# Altium schematic symbol library jlcpcb_2025_04_inductors_extended_0603.schlib: 1269 symbols (part 2 of 7) (continued)
## FEC0603CP-R10G-LRH
designator L?  Inductance: 100nH
Inductor, 100nH, ±2%, 580mΩ, 400mA, SMD 0603; Manufacturer: PSA(Prosperity Dielectrics); Manufacturer Part Number: FEC0603CP-R10G-LRH; Package Size: 0603; JLCPCB Basic Part: No; JLCPCB Part Number: C346335; Supplier 1: LCSC; Category: Inductors; Supplier Part Number 1: C346335; Tolerance: ±2%; Rated Current: 400mA; DC Resistance: 580mΩ; RoHS: Yes; ComponentLink1Description: Datasheet; ComponentLink1URL: https://wmsc.lcsc.com/wmsc/upload/file/pdf/v2/lcsc/2304140030_PSA-Prosperity-Dielectrics-FEC0603CP-R10G-LRH_C346335.pdf; ComponentLink2Description: JLCPCB Part URL; ComponentLink2URL: https://jlcpcb.com/partdetail/C346335; ComponentLink3Description: LCSC Part URL; ComponentLink3URL: https://lcsc.com/product-detail/Inductors-SMD_PSAProsperity-Dielectrics-PSAProsperity-Dielectrics-FEC0603CP-R10G-LRH_C346335.html
footprint IND-0603 (0603 (1608M) Inductor)
pins: 1, 2

## FEC0603CP-R11G-LRH
designator L?  Inductance: 110nH
Inductor, 110nH, ±2%, 610mΩ, 300mA, SMD 0603; Manufacturer: PSA(Prosperity Dielectrics); Manufacturer Part Number: FEC0603CP-R11G-LRH; Package Size: 0603; JLCPCB Basic Part: No; JLCPCB Part Number: C346336; Supplier 1: LCSC; Category: Inductors; Supplier Part Number 1: C346336; Tolerance: ±2%; Rated Current: 300mA; DC Resistance: 610mΩ; RoHS: Yes; ComponentLink1Description: Datasheet; ComponentLink1URL: https://wmsc.lcsc.com/wmsc/upload/file/pdf/v2/lcsc/2304140030_PSA-Prosperity-Dielectrics-FEC0603CP-R11G-LRH_C346336.pdf; ComponentLink2Description: JLCPCB Part URL; ComponentLink2URL: https://jlcpcb.com/partdetail/C346336; ComponentLink3Description: LCSC Part URL; ComponentLink3URL: https://lcsc.com/product-detail/Inductors-SMD_PSAProsperity-Dielectrics-PSAProsperity-Dielectrics-FEC0603CP-R11G-LRH_C346336.html
footprint IND-0603 (0603 (1608M) Inductor)
pins: 1, 2

## FEC0603CP-R15G-LRH
designator L?  Inductance: 150nH
Inductor, 150nH, ±2%, 920mΩ, 280mA, SMD 0603; Manufacturer: PSA(Prosperity Dielectrics); Manufacturer Part Number: FEC0603CP-R15G-LRH; Package Size: 0603; JLCPCB Basic Part: No; JLCPCB Part Number: C346338; Supplier 1: LCSC; Category: Inductors; Supplier Part Number 1: C346338; Tolerance: ±2%; Rated Current: 280mA; DC Resistance: 920mΩ; RoHS: Yes; ComponentLink1Description: Datasheet; ComponentLink1URL: https://wmsc.lcsc.com/wmsc/upload/file/pdf/v2/lcsc/2304140030_PSA-Prosperity-Dielectrics-FEC0603CP-R15G-LRH_C346338.pdf; ComponentLink2Description: JLCPCB Part URL; ComponentLink2URL: https://jlcpcb.com/partdetail/C346338; ComponentLink3Description: LCSC Part URL; ComponentLink3URL: https://lcsc.com/product-detail/Inductors-SMD_PSAProsperity-Dielectrics-PSAProsperity-Dielectrics-FEC0603CP-R15G-LRH_C346338.html
footprint IND-0603 (0603 (1608M) Inductor)
pins: 1, 2

## FEC0603CP-R20G-LRH
designator L?  Inductance: 200nH
Inductor, 200nH, ±2%, 1.98Ω, 200mA, SMD 0603; Manufacturer: PSA(Prosperity Dielectrics); Manufacturer Part Number: FEC0603CP-R20G-LRH; Package Size: 0603; JLCPCB Basic Part: No; JLCPCB Part Number: C346340; Supplier 1: LCSC; Category: Inductors; Supplier Part Number 1: C346340; Tolerance: ±2%; Rated Current: 200mA; DC Resistance: 1.98Ω; RoHS: Yes; ComponentLink1Description: Datasheet; ComponentLink1URL: https://wmsc.lcsc.com/wmsc/upload/file/pdf/v2/lcsc/2304140030_PSA-Prosperity-Dielectrics-FEC0603CP-R20G-LRH_C346340.pdf; ComponentLink2Description: JLCPCB Part URL; ComponentLink2URL: https://jlcpcb.com/partdetail/C346340; ComponentLink3Description: LCSC Part URL; ComponentLink3URL: https://lcsc.com/product-detail/Inductors-SMD_PSAProsperity-Dielectrics-PSAProsperity-Dielectrics-FEC0603CP-R20G-LRH_C346340.html
footprint IND-0603 (0603 (1608M) Inductor)
pins: 1, 2

## FEC0603CP-R21G-LRH
designator L?  Inductance: 210nH
Inductor, 210nH, ±2%, 2.06Ω, 200mA, SMD 0603; Manufacturer: PSA(Prosperity Dielectrics); Manufacturer Part Number: FEC0603CP-R21G-LRH; Package Size: 0603; JLCPCB Basic Part: No; JLCPCB Part Number: C346341; Supplier 1: LCSC; Category: Inductors; Supplier Part Number 1: C346341; Tolerance: ±2%; Rated Current: 200mA; DC Resistance: 2.06Ω; RoHS: Yes; ComponentLink1Description: Datasheet; ComponentLink1URL: https://wmsc.lcsc.com/wmsc/upload/file/pdf/v2/lcsc/2304140030_PSA-Prosperity-Dielectrics-FEC0603CP-R21G-LRH_C346341.pdf; ComponentLink2Description: JLCPCB Part URL; ComponentLink2URL: https://jlcpcb.com/partdetail/C346341; ComponentLink3Description: LCSC Part URL; ComponentLink3URL: https://lcsc.com/product-detail/Inductors-SMD_PSAProsperity-Dielectrics-PSAProsperity-Dielectrics-FEC0603CP-R21G-LRH_C346341.html
footprint IND-0603 (0603 (1608M) Inductor)
pins: 1, 2

## FEC0603CP-R22G-LRH
designator L?  Inductance: 220nH
Inductor, 220nH, ±2%, 1.9Ω, 200mA, SMD 0603; Manufacturer: PSA(Prosperity Dielectrics); Manufacturer Part Number: FEC0603CP-R22G-LRH; Package Size: 0603; JLCPCB Basic Part: No; JLCPCB Part Number: C329439; Supplier 1: LCSC; Category: Inductors; Supplier Part Number 1: C329439; Tolerance: ±2%; Rated Current: 200mA; DC Resistance: 1.9Ω; RoHS: Yes; ComponentLink1Description: Datasheet; ComponentLink1URL: https://wmsc.lcsc.com/wmsc/upload/file/pdf/v2/lcsc/2304140030_PSA-Prosperity-Dielectrics-FEC0603CP-R22G-LRH_C329439.pdf; ComponentLink2Description: JLCPCB Part URL; ComponentLink2URL: https://jlcpcb.com/partdetail/C329439; ComponentLink3Description: LCSC Part URL; ComponentLink3URL: https://lcsc.com/product-detail/Inductors-SMD_PSAProsperity-Dielectrics-PSAProsperity-Dielectrics-FEC0603CP-R22G-LRH_C329439.html
footprint IND-0603 (0603 (1608M) Inductor)
pins: 1, 2

## FEC0603CP-R25G-LRH
designator L?  Inductance: 250nH
Inductor, 250nH, ±2%, 3.55Ω, 120mA, SMD 0603; Manufacturer: PSA(Prosperity Dielectrics); Manufacturer Part Number: FEC0603CP-R25G-LRH; Package Size: 0603; JLCPCB Basic Part: No; JLCPCB Part Number: C346342; Supplier 1: LCSC; Category: Inductors; Supplier Part Number 1: C346342; Tolerance: ±2%; Rated Current: 120mA; DC Resistance: 3.55Ω; RoHS: Yes; ComponentLink1Description: Datasheet; ComponentLink1URL: https://wmsc.lcsc.com/wmsc/upload/file/pdf/v2/lcsc/2304140030_PSA-Prosperity-Dielectrics-FEC0603CP-R25G-LRH_C346342.pdf; ComponentLink2Description: JLCPCB Part URL; ComponentLink2URL: https://jlcpcb.com/partdetail/C346342; ComponentLink3Description: LCSC Part URL; ComponentLink3URL: https://lcsc.com/product-detail/Inductors-SMD_PSAProsperity-Dielectrics-PSAProsperity-Dielectrics-FEC0603CP-R25G-LRH_C346342.html
footprint IND-0603 (0603 (1608M) Inductor)
pins: 1, 2

## FEC0603CP-R27G-LRH
designator L?  Inductance: 270nH
Inductor, 270nH, ±2%, 2.3Ω, 170mA, SMD 0603; Manufacturer: PSA(Prosperity Dielectrics); Manufacturer Part Number: FEC0603CP-R27G-LRH; Package Size: 0603; JLCPCB Basic Part: No; JLCPCB Part Number: C346343; Supplier 1: LCSC; Category: Inductors; Supplier Part Number 1: C346343; Tolerance: ±2%; Rated Current: 170mA; DC Resistance: 2.3Ω; RoHS: Yes; ComponentLink1Description: Datasheet; ComponentLink1URL: https://wmsc.lcsc.com/wmsc/upload/file/pdf/v2/lcsc/2304140030_PSA-Prosperity-Dielectrics-FEC0603CP-R27G-LRH_C346343.pdf; ComponentLink2Description: JLCPCB Part URL; ComponentLink2URL: https://jlcpcb.com/partdetail/C346343; ComponentLink3Description: LCSC Part URL; ComponentLink3URL: https://lcsc.com/product-detail/Inductors-SMD_PSAProsperity-Dielectrics-PSAProsperity-Dielectrics-FEC0603CP-R27G-LRH_C346343.html
footprint IND-0603 (0603 (1608M) Inductor)
pins: 1, 2

## FEC0603CP-R39G-LRH
designator L?  Inductance: 390nH
Inductor, 390nH, ±2%, 4.35Ω, 100mA, SMD 0603; Manufacturer: PSA(Prosperity Dielectrics); Manufacturer Part Number: FEC0603CP-R39G-LRH; Package Size: 0603; JLCPCB Basic Part: No; JLCPCB Part Number: C346345; Supplier 1: LCSC; Category: Inductors; Supplier Part Number 1: C346345; Tolerance: ±2%; Rated Current: 100mA; DC Resistance: 4.35Ω; RoHS: Yes; ComponentLink1Description: Datasheet; ComponentLink1URL: https://wmsc.lcsc.com/wmsc/upload/file/pdf/v2/lcsc/2005211034_PSA-Prosperity-Dielectrics-FEC0603CP-R39G-LRH_C346345.pdf; ComponentLink2Description: JLCPCB Part URL; ComponentLink2URL: https://jlcpcb.com/partdetail/C346345; ComponentLink3Description: LCSC Part URL; ComponentLink3URL: https://lcsc.com/product-detail/Inductors-SMD_PSAProsperity-Dielectrics-PSAProsperity-Dielectrics-FEC0603CP-R39G-LRH_C346345.html
footprint IND-0603 (0603 (1608M) Inductor)
pins: 1, 2

## FHW0603PF1R0KST
designator L?  Inductance: 1uH
Inductor, 1uH, SMD 0603; Manufacturer: FH (Guangdong Fenghua Advanced Tech); Manufacturer Part Number: FHW0603PF1R0KST; Package Size: 0603; JLCPCB Basic Part: No; JLCPCB Part Number: C5137247; Supplier 1: LCSC; Category: Inductors; Supplier Part Number 1: C5137247; RoHS: Yes; ComponentLink1Description: Datasheet; ComponentLink1URL: https://wmsc.lcsc.com/wmsc/upload/file/pdf/v2/lcsc/2303141630_FH--Guangdong-Fenghua-Advanced-Tech-FHW0603PF1R0KST_C5137247.pdf; ComponentLink2Description: JLCPCB Part URL; ComponentLink2URL: https://jlcpcb.com/partdetail/C5137247; ComponentLink3Description: LCSC Part URL; ComponentLink3URL: https://lcsc.com/product-detail/Inductors-SMD_FH-Guangdong-Fenghua-Advanced-Tech-FH-Guangdong-Fenghua-Advanced-Tech-FHW0603PF1R0KST_C5137247.html
footprint IND-0603 (0603 (1608M) Inductor)
pins: 1, 2

## FHW0603UC1N6KST
designator L?  Inductance: 1.6nH
Inductor, 1.6nH, ±10%, 40mΩ, 700mA, SMD 0603; Manufacturer: FH(Guangdong Fenghua Advanced Tech); Manufacturer Part Number: FHW0603UC1N6KST; Self-Resonant Frequency: 12.5GHz; Q Factor: 18@250MHz; Package Size: 0603; JLCPCB Basic Part: No; JLCPCB Part Number: C317978; Supplier 1: LCSC; Category: Inductors; Supplier Part Number 1: C317978; Tolerance: ±10%; Rated Current: 700mA; DC Resistance: 40mΩ; RoHS: Yes; ComponentLink1Description: Datasheet; ComponentLink1URL: https://wmsc.lcsc.com/wmsc/upload/file/pdf/v2/lcsc/2302231208_FH--Guangdong-Fenghua-Advanced-Tech-FHW0603UC1N6KST_C317978.pdf; ComponentLink2Description: JLCPCB Part URL; ComponentLink2URL: https://jlcpcb.com/partdetail/C317978; ComponentLink3Description: LCSC Part URL; ComponentLink3URL: https://lcsc.com/product-detail/Inductors-SMD_FH-Guangdong-Fenghua-Advanced-Tech-FH-Guangdong-Fenghua-Advanced-Tech-FHW0603UC1N6KST_C317978.html
footprint IND-0603 (0603 (1608M) Inductor)
pins: 1, 2

## FHW0603UC1N8KST
designator L?  Inductance: 1.8nH
Inductor, 1.8nH, ±10%, 45mΩ, 700mA, SMD 0603; Manufacturer: FH(Guangdong Fenghua Advanced Tech); Manufacturer Part Number: FHW0603UC1N8KST; Self-Resonant Frequency: 12.5GHz; Q Factor: 16@250MHz; Package Size: 0603; JLCPCB Basic Part: No; JLCPCB Part Number: C317979; Supplier 1: LCSC; Category: Inductors; Supplier Part Number 1: C317979; Tolerance: ±10%; Rated Current: 700mA; DC Resistance: 45mΩ; RoHS: Yes; ComponentLink1Description: Datasheet; ComponentLink1URL: https://wmsc.lcsc.com/wmsc/upload/file/pdf/v2/lcsc/2302231208_FH--Guangdong-Fenghua-Advanced-Tech-FHW0603UC1N8KST_C317979.pdf; ComponentLink2Description: JLCPCB Part URL; ComponentLink2URL: https://jlcpcb.com/partdetail/C317979; ComponentLink3Description: LCSC Part URL; ComponentLink3URL: https://lcsc.com/product-detail/Inductors-SMD_FH-Guangdong-Fenghua-Advanced-Tech-FH-Guangdong-Fenghua-Advanced-Tech-FHW0603UC1N8KST_C317979.html
footprint IND-0603 (0603 (1608M) Inductor)
pins: 1, 2

## FHW0603UC2N2KST
designator L?  Inductance: 2.2nH
Inductor, 2.2nH, ±10%, 90mΩ, 700mA, SMD 0603; Manufacturer: FH(Guangdong Fenghua Advanced Tech); Manufacturer Part Number: FHW0603UC2N2KST; Self-Resonant Frequency: 10GHz; Q Factor: 12@250MHz; Package Size: 0603; JLCPCB Basic Part: No; JLCPCB Part Number: C317980; Supplier 1: LCSC; Category: Inductors; Supplier Part Number 1: C317980; Tolerance: ±10%; Rated Current: 700mA; DC Resistance: 90mΩ; RoHS: Yes; ComponentLink1Description: Datasheet; ComponentLink1URL: https://wmsc.lcsc.com/wmsc/upload/file/pdf/v2/lcsc/2302231208_FH--Guangdong-Fenghua-Advanced-Tech-FHW0603UC2N2KST_C317980.pdf; ComponentLink2Description: JLCPCB Part URL; ComponentLink2URL: https://jlcpcb.com/partdetail/C317980; ComponentLink3Description: LCSC Part URL; ComponentLink3URL: https://lcsc.com/product-detail/Inductors-SMD_FH-Guangdong-Fenghua-Advanced-Tech-FH-Guangdong-Fenghua-Advanced-Tech-FHW0603UC2N2KST_C317980.html
footprint IND-0603 (0603 (1608M) Inductor)
pins: 1, 2

## FHW0603UC3N3KST
designator L?  Inductance: 3.3nH
Inductor, 3.3nH, ±10%, 75mΩ, 700mA, SMD 0603; Manufacturer: FH(Guangdong Fenghua Advanced Tech); Manufacturer Part Number: FHW0603UC3N3KST; Self-Resonant Frequency: 5.9GHz; Q Factor: 20@250MHz; Package Size: 0603; JLCPCB Basic Part: No; JLCPCB Part Number: C317981; Supplier 1: LCSC; Category: Inductors; Supplier Part Number 1: C317981; Tolerance: ±10%; Rated Current: 700mA; DC Resistance: 75mΩ; RoHS: Yes; ComponentLink1Description: Datasheet; ComponentLink1URL: https://wmsc.lcsc.com/wmsc/upload/file/pdf/v2/lcsc/2302231208_FH--Guangdong-Fenghua-Advanced-Tech-FHW0603UC3N3KST_C317981.pdf; ComponentLink2Description: JLCPCB Part URL; ComponentLink2URL: https://jlcpcb.com/partdetail/C317981; ComponentLink3Description: LCSC Part URL; ComponentLink3URL: https://lcsc.com/product-detail/Inductors-SMD_FH-Guangdong-Fenghua-Advanced-Tech-FH-Guangdong-Fenghua-Advanced-Tech-FHW0603UC3N3KST_C317981.html
footprint IND-0603 (0603 (1608M) Inductor)
pins: 1, 2

## FHW0603UC3N6JST
designator L?  Inductance: 3.6nH
Inductor, 3.6nH, ±5%, SMD 0603; Manufacturer: FH(Guangdong Fenghua Advanced Tech); Manufacturer Part Number: FHW0603UC3N6JST; Package Size: 0603; JLCPCB Basic Part: No; JLCPCB Part Number: C304270; Supplier 1: LCSC; Category: Inductors; Supplier Part Number 1: C304270; Tolerance: ±5%; RoHS: Yes; ComponentLink1Description: Datasheet; ComponentLink1URL: https://wmsc.lcsc.com/wmsc/upload/file/pdf/v2/lcsc/2302231030_FH--Guangdong-Fenghua-Advanced-Tech-FHW0603UC3N6JST_C304270.pdf; ComponentLink2Description: JLCPCB Part URL; ComponentLink2URL: https://jlcpcb.com/partdetail/C304270; ComponentLink3Description: LCSC Part URL; ComponentLink3URL: https://lcsc.com/product-detail/Inductors-SMD_FH-Guangdong-Fenghua-Advanced-Tech-FH-Guangdong-Fenghua-Advanced-Tech-FHW0603UC3N6JST_C304270.html
footprint IND-0603 (0603 (1608M) Inductor)
pins: 1, 2

## FHW0603UC3N6KST
designator L?  Inductance: 3.6nH
Inductor, 3.6nH, ±10%, SMD 0603; Manufacturer: FH(Guangdong Fenghua Advanced Tech); Manufacturer Part Number: FHW0603UC3N6KST; Package Size: 0603; JLCPCB Basic Part: No; JLCPCB Part Number: C395034; Supplier 1: LCSC; Category: Inductors; Supplier Part Number 1: C395034; Tolerance: ±10%; RoHS: Yes; ComponentLink1Description: Datasheet; ComponentLink1URL: https://wmsc.lcsc.com/wmsc/upload/file/pdf/v2/lcsc/2302231208_FH--Guangdong-Fenghua-Advanced-Tech-FHW0603UC3N6KST_C395034.pdf; ComponentLink2Description: JLCPCB Part URL; ComponentLink2URL: https://jlcpcb.com/partdetail/C395034; ComponentLink3Description: LCSC Part URL; ComponentLink3URL: https://lcsc.com/product-detail/Inductors-SMD_FH-Guangdong-Fenghua-Advanced-Tech-FH-Guangdong-Fenghua-Advanced-Tech-FHW0603UC3N6KST_C395034.html
footprint IND-0603 (0603 (1608M) Inductor)
pins: 1, 2

## FHW0603UC3N9JST
designator L?  Inductance: 3.9nH
Inductor, 3.9nH, ±5%, 80mΩ, 700mA, SMD 0603; Manufacturer: FH(Guangdong Fenghua Advanced Tech); Manufacturer Part Number: FHW0603UC3N9JST; Self-Resonant Frequency: 6.9GHz; Q Factor: 22@250MHz; Package Size: 0603; JLCPCB Basic Part: No; JLCPCB Part Number: C317982; Supplier 1: LCSC; Category: Inductors; Supplier Part Number 1: C317982; Tolerance: ±5%; Rated Current: 700mA; DC Resistance: 80mΩ; RoHS: Yes; ComponentLink1Description: Datasheet; ComponentLink1URL: https://wmsc.lcsc.com/wmsc/upload/file/pdf/v2/lcsc/2302231208_FH--Guangdong-Fenghua-Advanced-Tech-FHW0603UC3N9JST_C317982.pdf; ComponentLink2Description: JLCPCB Part URL; ComponentLink2URL: https://jlcpcb.com/partdetail/C317982; ComponentLink3Description: LCSC Part URL; ComponentLink3URL: https://lcsc.com/product-detail/Inductors-SMD_FH-Guangdong-Fenghua-Advanced-Tech-FH-Guangdong-Fenghua-Advanced-Tech-FHW0603UC3N9JST_C317982.html
footprint IND-0603 (0603 (1608M) Inductor)
pins: 1, 2

## FHW0603UC4N7JGT
designator L?  Inductance: 4.7nH
Inductor, 4.7nH, ±5%, 116mΩ, 700mA, SMD 0603; Manufacturer: FH(Guangdong Fenghua Advanced Tech); Manufacturer Part Number: FHW0603UC4N7JGT; Self-Resonant Frequency: 5.8GHz; Q Factor: 20@250MHz; Package Size: 0603; JLCPCB Basic Part: No; JLCPCB Part Number: C139256; Supplier 1: LCSC; Category: Inductors; Supplier Part Number 1: C139256; Tolerance: ±5%; Rated Current: 700mA; DC Resistance: 116mΩ; RoHS: Yes; ComponentLink1Description: Datasheet; ComponentLink1URL: https://wmsc.lcsc.com/wmsc/upload/file/pdf/v2/lcsc/2110111630_FH--Guangdong-Fenghua-Advanced-Tech-FHW0603UC4N7JGT_C139256.pdf; ComponentLink2Description: JLCPCB Part URL; ComponentLink2URL: https://jlcpcb.com/partdetail/C139256; ComponentLink3Description: LCSC Part URL; ComponentLink3URL: https://lcsc.com/product-detail/Inductors-SMD_FH-Guangdong-Fenghua-Advanced-Tech-FH-Guangdong-Fenghua-Advanced-Tech-FHW0603UC4N7JGT_C139256.html
footprint IND-0603 (0603 (1608M) Inductor)
pins: 1, 2

## FHW0603UC4N7JST
designator L?  Inductance: 4.7nH
Inductor, 4.7nH, ±5%, 116mΩ, 700mA, SMD 0603; Manufacturer: FH(Guangdong Fenghua Advanced Tech); Manufacturer Part Number: FHW0603UC4N7JST; Self-Resonant Frequency: 5.8GHz; Q Factor: 20@250MHz; Package Size: 0603; JLCPCB Basic Part: No; JLCPCB Part Number: C317983; Supplier 1: LCSC; Category: Inductors; Supplier Part Number 1: C317983; Tolerance: ±5%; Rated Current: 700mA; DC Resistance: 116mΩ; RoHS: Yes; ComponentLink1Description: Datasheet; ComponentLink1URL: https://wmsc.lcsc.com/wmsc/upload/file/pdf/v2/lcsc/2302231208_FH--Guangdong-Fenghua-Advanced-Tech-FHW0603UC4N7JST_C317983.pdf; ComponentLink2Description: JLCPCB Part URL; ComponentLink2URL: https://jlcpcb.com/partdetail/C317983; ComponentLink3Description: LCSC Part URL; ComponentLink3URL: https://lcsc.com/product-detail/Inductors-SMD_FH-Guangdong-Fenghua-Advanced-Tech-FH-Guangdong-Fenghua-Advanced-Tech-FHW0603UC4N7JST_C317983.html
footprint IND-0603 (0603 (1608M) Inductor)
pins: 1, 2

## FHW0603UC5N1JST
designator L?  Inductance: 5.1nH
Inductor, 5.1nH, ±5%, SMD 0603; Manufacturer: FH(Guangdong Fenghua Advanced Tech); Manufacturer Part Number: FHW0603UC5N1JST; Package Size: 0603; JLCPCB Basic Part: No; JLCPCB Part Number: C395036; Supplier 1: LCSC; Category: Inductors; Supplier Part Number 1: C395036; Tolerance: ±5%; RoHS: Yes; ComponentLink1Description: Datasheet; ComponentLink1URL: https://wmsc.lcsc.com/wmsc/upload/file/pdf/v2/lcsc/2302231208_FH--Guangdong-Fenghua-Advanced-Tech-FHW0603UC5N1JST_C395036.pdf; ComponentLink2Description: JLCPCB Part URL; ComponentLink2URL: https://jlcpcb.com/partdetail/C395036; ComponentLink3Description: LCSC Part URL; ComponentLink3URL: https://lcsc.com/product-detail/Inductors-SMD_FH-Guangdong-Fenghua-Advanced-Tech-FH-Guangdong-Fenghua-Advanced-Tech-FHW0603UC5N1JST_C395036.html
footprint IND-0603 (0603 (1608M) Inductor)
pins: 1, 2

## FHW0603UC5N6KST
designator L?  Inductance: 5.6nH
Inductor, 5.6nH, ±10%, 200mΩ, 700mA, SMD 0603; Manufacturer: FH(Guangdong Fenghua Advanced Tech); Manufacturer Part Number: FHW0603UC5N6KST; Self-Resonant Frequency: 5.7GHz; Q Factor: 18@250MHz; Package Size: 0603; JLCPCB Basic Part: No; JLCPCB Part Number: C317984; Supplier 1: LCSC; Category: Inductors; Supplier Part Number 1: C317984; Tolerance: ±10%; Rated Current: 700mA; DC Resistance: 200mΩ; RoHS: Yes; ComponentLink1Description: Datasheet; ComponentLink1URL: https://wmsc.lcsc.com/wmsc/upload/file/pdf/v2/lcsc/2302231208_FH--Guangdong-Fenghua-Advanced-Tech-FHW0603UC5N6KST_C317984.pdf; ComponentLink2Description: JLCPCB Part URL; ComponentLink2URL: https://jlcpcb.com/partdetail/C317984; ComponentLink3Description: LCSC Part URL; ComponentLink3URL: https://lcsc.com/product-detail/Inductors-SMD_FH-Guangdong-Fenghua-Advanced-Tech-FH-Guangdong-Fenghua-Advanced-Tech-FHW0603UC5N6KST_C317984.html
footprint IND-0603 (0603 (1608M) Inductor)
pins: 1, 2

## FHW0603UC6N8JST
designator L?  Inductance: 6.8nH
Inductor, 6.8nH, ±5%, 110mΩ, 700mA, SMD 0603; Manufacturer: FH(Guangdong Fenghua Advanced Tech); Manufacturer Part Number: FHW0603UC6N8JST; Self-Resonant Frequency: 5.8GHz; Q Factor: 27@250MHz; Package Size: 0603; JLCPCB Basic Part: No; JLCPCB Part Number: C295691; Supplier 1: LCSC; Category: Inductors; Supplier Part Number 1: C295691; Tolerance: ±5%; Rated Current: 700mA; DC Resistance: 110mΩ; RoHS: Yes; ComponentLink1Description: Datasheet; ComponentLink1URL: https://wmsc.lcsc.com/wmsc/upload/file/pdf/v2/lcsc/2302231208_FH--Guangdong-Fenghua-Advanced-Tech-FHW0603UC6N8JST_C295691.pdf; ComponentLink2Description: JLCPCB Part URL; ComponentLink2URL: https://jlcpcb.com/partdetail/C295691; ComponentLink3Description: LCSC Part URL; ComponentLink3URL: https://lcsc.com/product-detail/Inductors-SMD_FH-Guangdong-Fenghua-Advanced-Tech-FH-Guangdong-Fenghua-Advanced-Tech-FHW0603UC6N8JST_C295691.html
footprint IND-0603 (0603 (1608M) Inductor)
pins: 1, 2

## FHW0603UC7N5JST
designator L?  Inductance: 7.5nH
Inductor, 7.5nH, ±5%, 110mΩ, 700mA, SMD 0603; Manufacturer: FH(Guangdong Fenghua Advanced Tech); Manufacturer Part Number: FHW0603UC7N5JST; Self-Resonant Frequency: 4.8GHz; Q Factor: 28@250MHz; Package Size: 0603; JLCPCB Basic Part: No; JLCPCB Part Number: C317985; Supplier 1: LCSC; Category: Inductors; Supplier Part Number 1: C317985; Tolerance: ±5%; Rated Current: 700mA; DC Resistance: 110mΩ; RoHS: Yes; ComponentLink1Description: Datasheet; ComponentLink1URL: https://wmsc.lcsc.com/wmsc/upload/file/pdf/v2/lcsc/2302231208_FH--Guangdong-Fenghua-Advanced-Tech-FHW0603UC7N5JST_C317985.pdf; ComponentLink2Description: JLCPCB Part URL; ComponentLink2URL: https://jlcpcb.com/partdetail/C317985; ComponentLink3Description: LCSC Part URL; ComponentLink3URL: https://lcsc.com/product-detail/Inductors-SMD_FH-Guangdong-Fenghua-Advanced-Tech-FH-Guangdong-Fenghua-Advanced-Tech-FHW0603UC7N5JST_C317985.html
footprint IND-0603 (0603 (1608M) Inductor)
pins: 1, 2

## FHW0603UC8N2JGT
designator L?  Inductance: 8.2nH
Inductor, 8.2nH, ±5%, 120mΩ, 700mA, SMD 0603; Manufacturer: FH(Guangdong Fenghua Advanced Tech); Manufacturer Part Number: FHW0603UC8N2JGT; Self-Resonant Frequency: 4.7GHz; Q Factor: 28@250MHz; Package Size: 0603; JLCPCB Basic Part: No; JLCPCB Part Number: C401484; Supplier 1: LCSC; Category: Inductors; Supplier Part Number 1: C401484; Tolerance: ±5%; Rated Current: 700mA; DC Resistance: 120mΩ; RoHS: Yes; ComponentLink1Description: Datasheet; ComponentLink1URL: https://wmsc.lcsc.com/wmsc/upload/file/pdf/v2/lcsc/2110111730_FH--Guangdong-Fenghua-Advanced-Tech-FHW0603UC8N2JGT_C401484.pdf; ComponentLink2Description: JLCPCB Part URL; ComponentLink2URL: https://jlcpcb.com/partdetail/C401484; ComponentLink3Description: LCSC Part URL; ComponentLink3URL: https://lcsc.com/product-detail/Inductors-SMD_FH-Guangdong-Fenghua-Advanced-Tech-FH-Guangdong-Fenghua-Advanced-Tech-FHW0603UC8N2JGT_C401484.html
footprint IND-0603 (0603 (1608M) Inductor)
pins: 1, 2

## FHW0603UC8N2JST
designator L?  Inductance: 8.2nH
Inductor, 8.2nH, ±5%, 120mΩ, 700mA, SMD 0603; Manufacturer: FH(Guangdong Fenghua Advanced Tech); Manufacturer Part Number: FHW0603UC8N2JST; Self-Resonant Frequency: 4.7GHz; Q Factor: 28@250MHz; Package Size: 0603; JLCPCB Basic Part: No; JLCPCB Part Number: C304271; Supplier 1: LCSC; Category: Inductors; Supplier Part Number 1: C304271; Tolerance: ±5%; Rated Current: 700mA; DC Resistance: 120mΩ; RoHS: Yes; ComponentLink1Description: Datasheet; ComponentLink1URL: https://wmsc.lcsc.com/wmsc/upload/file/pdf/v2/lcsc/2302231030_FH--Guangdong-Fenghua-Advanced-Tech-FHW0603UC8N2JST_C304271.pdf; ComponentLink2Description: JLCPCB Part URL; ComponentLink2URL: https://jlcpcb.com/partdetail/C304271; ComponentLink3Description: LCSC Part URL; ComponentLink3URL: https://lcsc.com/product-detail/Inductors-SMD_FH-Guangdong-Fenghua-Advanced-Tech-FH-Guangdong-Fenghua-Advanced-Tech-FHW0603UC8N2JST_C304271.html
footprint IND-0603 (0603 (1608M) Inductor)
pins: 1, 2

## FHW0603UC9N1JST
designator L?  Inductance: 9.1nH
Inductor, 9.1nH, ±5%, SMD 0603; Manufacturer: FH(Guangdong Fenghua Advanced Tech); Manufacturer Part Number: FHW0603UC9N1JST; Package Size: 0603; JLCPCB Basic Part: No; JLCPCB Part Number: C295692; Supplier 1: LCSC; Category: Inductors; Supplier Part Number 1: C295692; Tolerance: ±5%; RoHS: Yes; ComponentLink1Description: Datasheet; ComponentLink1URL: https://wmsc.lcsc.com/wmsc/upload/file/pdf/v2/lcsc/2302231208_FH--Guangdong-Fenghua-Advanced-Tech-FHW0603UC9N1JST_C295692.pdf; ComponentLink2Description: JLCPCB Part URL; ComponentLink2URL: https://jlcpcb.com/partdetail/C295692; ComponentLink3Description: LCSC Part URL; ComponentLink3URL: https://lcsc.com/product-detail/Inductors-SMD_FH-Guangdong-Fenghua-Advanced-Tech-FH-Guangdong-Fenghua-Advanced-Tech-FHW0603UC9N1JST_C295692.html
footprint IND-0603 (0603 (1608M) Inductor)
pins: 1, 2

## FHW0603UC010JST
designator L?  Inductance: 10nH
Inductor, 10nH, ±5%, 130mΩ, 700mA, SMD 0603; Manufacturer: FH(Guangdong Fenghua Advanced Tech); Manufacturer Part Number: FHW0603UC010JST; Self-Resonant Frequency: 4.8GHz; Q Factor: 31@250MHz; Package Size: 0603; JLCPCB Basic Part: No; JLCPCB Part Number: C295693; Supplier 1: LCSC; Category: Inductors; Supplier Part Number 1: C295693; Tolerance: ±5%; Rated Current: 700mA; DC Resistance: 130mΩ; RoHS: Yes; ComponentLink1Description: Datasheet; ComponentLink1URL: https://wmsc.lcsc.com/wmsc/upload/file/pdf/v2/lcsc/2302231208_FH--Guangdong-Fenghua-Advanced-Tech-FHW0603UC010JST_C295693.pdf; ComponentLink2Description: JLCPCB Part URL; ComponentLink2URL: https://jlcpcb.com/partdetail/C295693; ComponentLink3Description: LCSC Part URL; ComponentLink3URL: https://lcsc.com/product-detail/Inductors-SMD_FH-Guangdong-Fenghua-Advanced-Tech-FH-Guangdong-Fenghua-Advanced-Tech-FHW0603UC010JST_C295693.html
footprint IND-0603 (0603 (1608M) Inductor)
pins: 1, 2

## FHW0603UC010KST
designator L?  Inductance: 10nH
Inductor, 10nH, ±10%, 130mΩ, 700mA, SMD 0603; Manufacturer: FH(Guangdong Fenghua Advanced Tech); Manufacturer Part Number: FHW0603UC010KST; Package Size: 0603; JLCPCB Basic Part: No; JLCPCB Part Number: C304266; Supplier 1: LCSC; Category: Inductors; Supplier Part Number 1: C304266; Tolerance: ±10%; Rated Current: 700mA; DC Resistance: 130mΩ; RoHS: Yes; ComponentLink1Description: Datasheet; ComponentLink1URL: https://wmsc.lcsc.com/wmsc/upload/file/pdf/v2/lcsc/2302231030_FH--Guangdong-Fenghua-Advanced-Tech-FHW0603UC010KST_C304266.pdf; ComponentLink2Description: JLCPCB Part URL; ComponentLink2URL: https://jlcpcb.com/partdetail/C304266; ComponentLink3Description: LCSC Part URL; ComponentLink3URL: https://lcsc.com/product-detail/Inductors-SMD_FH-Guangdong-Fenghua-Advanced-Tech-FH-Guangdong-Fenghua-Advanced-Tech-FHW0603UC010KST_C304266.html
footprint IND-0603 (0603 (1608M) Inductor)
pins: 1, 2

## FHW0603UC012JST
designator L?  Inductance: 12nH
Inductor, 12nH, ±5%, 130mΩ, 700mA, SMD 0603; Manufacturer: FH(Guangdong Fenghua Advanced Tech); Manufacturer Part Number: FHW0603UC012JST; Self-Resonant Frequency: 4GHz; Q Factor: 35@250MHz; Package Size: 0603; JLCPCB Basic Part: No; JLCPCB Part Number: C317986; Supplier 1: LCSC; Category: Inductors; Supplier Part Number 1: C317986; Tolerance: ±5%; Rated Current: 700mA; DC Resistance: 130mΩ; RoHS: Yes; ComponentLink1Description: Datasheet; ComponentLink1URL: https://wmsc.lcsc.com/wmsc/upload/file/pdf/v2/lcsc/2302231208_FH--Guangdong-Fenghua-Advanced-Tech-FHW0603UC012JST_C317986.pdf; ComponentLink2Description: JLCPCB Part URL; ComponentLink2URL: https://jlcpcb.com/partdetail/C317986; ComponentLink3Description: LCSC Part URL; ComponentLink3URL: https://lcsc.com/product-detail/Inductors-SMD_FH-Guangdong-Fenghua-Advanced-Tech-FH-Guangdong-Fenghua-Advanced-Tech-FHW0603UC012JST_C317986.html
footprint IND-0603 (0603 (1608M) Inductor)
pins: 1, 2

## FHW0603UC015GST
designator L?  Inductance: 15nH
Inductor, 15nH, ±2%, 150mΩ, 700mA, SMD 0603; Manufacturer: FH(Guangdong Fenghua Advanced Tech); Manufacturer Part Number: FHW0603UC015GST; Package Size: 0603; JLCPCB Basic Part: No; JLCPCB Part Number: C304267; Supplier 1: LCSC; Category: Inductors; Supplier Part Number 1: C304267; Tolerance: ±2%; Rated Current: 700mA; DC Resistance: 150mΩ; RoHS: Yes; ComponentLink1Description: Datasheet; ComponentLink1URL: https://wmsc.lcsc.com/wmsc/upload/file/pdf/v2/lcsc/2302231030_FH--Guangdong-Fenghua-Advanced-Tech-FHW0603UC015GST_C304267.pdf; ComponentLink2Description: JLCPCB Part URL; ComponentLink2URL: https://jlcpcb.com/partdetail/C304267; ComponentLink3Description: LCSC Part URL; ComponentLink3URL: https://lcsc.com/product-detail/Inductors-SMD_FH-Guangdong-Fenghua-Advanced-Tech-FH-Guangdong-Fenghua-Advanced-Tech-FHW0603UC015GST_C304267.html
footprint IND-0603 (0603 (1608M) Inductor)
pins: 1, 2

## FHW0603UC015JST
designator L?  Inductance: 15nH
Inductor, 15nH, ±5%, 150mΩ, 700mA, SMD 0603; Manufacturer: FH(Guangdong Fenghua Advanced Tech); Manufacturer Part Number: FHW0603UC015JST; Self-Resonant Frequency: 4GHz; Q Factor: 30@250MHz; Package Size: 0603; JLCPCB Basic Part: No; JLCPCB Part Number: C295694; Supplier 1: LCSC; Category: Inductors; Supplier Part Number 1: C295694; Tolerance: ±5%; Rated Current: 700mA; DC Resistance: 150mΩ; RoHS: Yes; ComponentLink1Description: Datasheet; ComponentLink1URL: https://wmsc.lcsc.com/wmsc/upload/file/pdf/v2/lcsc/2302231208_FH--Guangdong-Fenghua-Advanced-Tech-FHW0603UC015JST_C295694.pdf; ComponentLink2Description: JLCPCB Part URL; ComponentLink2URL: https://jlcpcb.com/partdetail/C295694; ComponentLink3Description: LCSC Part URL; ComponentLink3URL: https://lcsc.com/product-detail/Inductors-SMD_FH-Guangdong-Fenghua-Advanced-Tech-FH-Guangdong-Fenghua-Advanced-Tech-FHW0603UC015JST_C295694.html
footprint IND-0603 (0603 (1608M) Inductor)
pins: 1, 2

## FHW0603UC018JST
designator L?  Inductance: 18nH
Inductor, 18nH, ±5%, 170mΩ, 700mA, SMD 0603; Manufacturer: FH(Guangdong Fenghua Advanced Tech); Manufacturer Part Number: FHW0603UC018JST; Self-Resonant Frequency: 3.1GHz; Q Factor: 35@250MHz; Package Size: 0603; JLCPCB Basic Part: No; JLCPCB Part Number: C295695; Supplier 1: LCSC; Category: Inductors; Supplier Part Number 1: C295695; Tolerance: ±5%; Rated Current: 700mA; DC Resistance: 170mΩ; RoHS: Yes; ComponentLink1Description: Datasheet; ComponentLink1URL: https://wmsc.lcsc.com/wmsc/upload/file/pdf/v2/lcsc/2302231208_FH--Guangdong-Fenghua-Advanced-Tech-FHW0603UC018JST_C295695.pdf; ComponentLink2Description: JLCPCB Part URL; ComponentLink2URL: https://jlcpcb.com/partdetail/C295695; ComponentLink3Description: LCSC Part URL; ComponentLink3URL: https://lcsc.com/product-detail/Inductors-SMD_FH-Guangdong-Fenghua-Advanced-Tech-FH-Guangdong-Fenghua-Advanced-Tech-FHW0603UC018JST_C295695.html
footprint IND-0603 (0603 (1608M) Inductor)
pins: 1, 2

## FHW0603UC022JST
designator L?  Inductance: 22nH
Inductor, 22nH, ±5%, 190mΩ, 700mA, SMD 0603; Manufacturer: FH(Guangdong Fenghua Advanced Tech); Manufacturer Part Number: FHW0603UC022JST; Self-Resonant Frequency: 3GHz; Q Factor: 38@250MHz; Package Size: 0603; JLCPCB Basic Part: No; JLCPCB Part Number: C139252; Supplier 1: LCSC; Category: Inductors; Supplier Part Number 1: C139252; Tolerance: ±5%; Rated Current: 700mA; DC Resistance: 190mΩ; RoHS: Yes; ComponentLink1Description: Datasheet; ComponentLink1URL: https://wmsc.lcsc.com/wmsc/upload/file/pdf/v2/lcsc/2302231230_FH--Guangdong-Fenghua-Advanced-Tech-FHW0603UC022JST_C139252.pdf; ComponentLink2Description: JLCPCB Part URL; ComponentLink2URL: https://jlcpcb.com/partdetail/C139252; ComponentLink3Description: LCSC Part URL; ComponentLink3URL: https://lcsc.com/product-detail/Inductors-SMD_FH-Guangdong-Fenghua-Advanced-Tech-FH-Guangdong-Fenghua-Advanced-Tech-FHW0603UC022JST_C139252.html
footprint IND-0603 (0603 (1608M) Inductor)
pins: 1, 2

## FHW0603UC027JST
designator L?  Inductance: 27nH
Inductor, 27nH, ±5%, 220mΩ, 600mA, SMD 0603; Manufacturer: FH(Guangdong Fenghua Advanced Tech); Manufacturer Part Number: FHW0603UC027JST; Self-Resonant Frequency: 2.8GHz; Q Factor: 36@250MHz; Package Size: 0603; JLCPCB Basic Part: No; JLCPCB Part Number: C295696; Supplier 1: LCSC; Category: Inductors; Supplier Part Number 1: C295696; Tolerance: ±5%; Rated Current: 600mA; DC Resistance: 220mΩ; RoHS: Yes; ComponentLink1Description: Datasheet; ComponentLink1URL: https://wmsc.lcsc.com/wmsc/upload/file/pdf/v2/lcsc/2302231208_FH--Guangdong-Fenghua-Advanced-Tech-FHW0603UC027JST_C295696.pdf; ComponentLink2Description: JLCPCB Part URL; ComponentLink2URL: https://jlcpcb.com/partdetail/C295696; ComponentLink3Description: LCSC Part URL; ComponentLink3URL: https://lcsc.com/product-detail/Inductors-SMD_FH-Guangdong-Fenghua-Advanced-Tech-FH-Guangdong-Fenghua-Advanced-Tech-FHW0603UC027JST_C295696.html
footprint IND-0603 (0603 (1608M) Inductor)
pins: 1, 2

## FHW0603UC033JST
designator L?  Inductance: 33nH
Inductor, 33nH, ±5%, 220mΩ, 600mA, SMD 0603; Manufacturer: FH(Guangdong Fenghua Advanced Tech); Manufacturer Part Number: FHW0603UC033JST; Self-Resonant Frequency: 2.3GHz; Q Factor: 36@250MHz; Package Size: 0603; JLCPCB Basic Part: No; JLCPCB Part Number: C317987; Supplier 1: LCSC; Category: Inductors; Supplier Part Number 1: C317987; Tolerance: ±5%; Rated Current: 600mA; DC Resistance: 220mΩ; RoHS: Yes; ComponentLink1Description: Datasheet; ComponentLink1URL: https://wmsc.lcsc.com/wmsc/upload/file/pdf/v2/lcsc/2302231208_FH--Guangdong-Fenghua-Advanced-Tech-FHW0603UC033JST_C317987.pdf; ComponentLink2Description: JLCPCB Part URL; ComponentLink2URL: https://jlcpcb.com/partdetail/C317987; ComponentLink3Description: LCSC Part URL; ComponentLink3URL: https://lcsc.com/product-detail/Inductors-SMD_FH-Guangdong-Fenghua-Advanced-Tech-FH-Guangdong-Fenghua-Advanced-Tech-FHW0603UC033JST_C317987.html
footprint IND-0603 (0603 (1608M) Inductor)
pins: 1, 2

## FHW0603UC036JST
designator L?  Inductance: 36nH
Inductor, 36nH, ±5%, SMD 0603; Manufacturer: FH(Guangdong Fenghua Advanced Tech); Manufacturer Part Number: FHW0603UC036JST; Package Size: 0603; JLCPCB Basic Part: No; JLCPCB Part Number: C395032; Supplier 1: LCSC; Category: Inductors; Supplier Part Number 1: C395032; Tolerance: ±5%; RoHS: Yes; ComponentLink1Description: Datasheet; ComponentLink1URL: https://wmsc.lcsc.com/wmsc/upload/file/pdf/v2/lcsc/2302231208_FH--Guangdong-Fenghua-Advanced-Tech-FHW0603UC036JST_C395032.pdf; ComponentLink2Description: JLCPCB Part URL; ComponentLink2URL: https://jlcpcb.com/partdetail/C395032; ComponentLink3Description: LCSC Part URL; ComponentLink3URL: https://lcsc.com/product-detail/Inductors-SMD_FH-Guangdong-Fenghua-Advanced-Tech-FH-Guangdong-Fenghua-Advanced-Tech-FHW0603UC036JST_C395032.html
footprint IND-0603 (0603 (1608M) Inductor)
pins: 1, 2

## FHW0603UC039JST
designator L?  Inductance: 39nH
Inductor, 39nH, ±5%, 250mΩ, 600mA, SMD 0603; Manufacturer: FH(Guangdong Fenghua Advanced Tech); Manufacturer Part Number: FHW0603UC039JST; Self-Resonant Frequency: 2.2GHz; Q Factor: 40@250MHz; Package Size: 0603; JLCPCB Basic Part: No; JLCPCB Part Number: C295697; Supplier 1: LCSC; Category: Inductors; Supplier Part Number 1: C295697; Tolerance: ±5%; Rated Current: 600mA; DC Resistance: 250mΩ; RoHS: Yes; ComponentLink1Description: Datasheet; ComponentLink1URL: https://wmsc.lcsc.com/wmsc/upload/file/pdf/v2/lcsc/2302231208_FH--Guangdong-Fenghua-Advanced-Tech-FHW0603UC039JST_C295697.pdf; ComponentLink2Description: JLCPCB Part URL; ComponentLink2URL: https://jlcpcb.com/partdetail/C295697; ComponentLink3Description: LCSC Part URL; ComponentLink3URL: https://lcsc.com/product-detail/Inductors-SMD_FH-Guangdong-Fenghua-Advanced-Tech-FH-Guangdong-Fenghua-Advanced-Tech-FHW0603UC039JST_C295697.html
footprint IND-0603 (0603 (1608M) Inductor)
pins: 1, 2

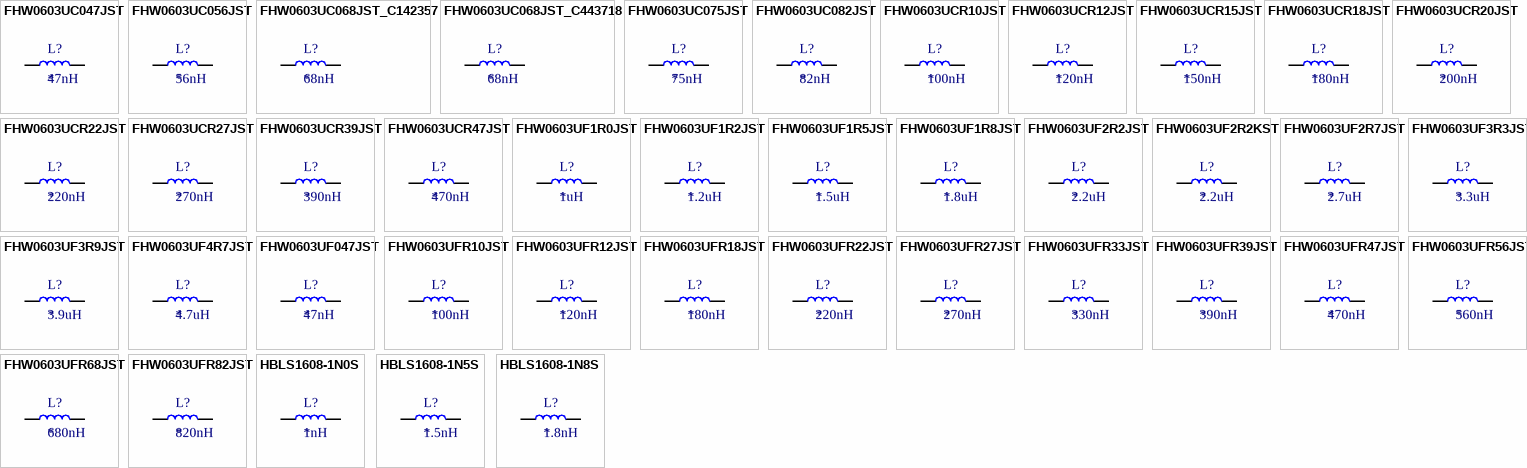
[diagram p8: symbols FHW0603UC047JST to HBLS1608-1N8S]

## FHW0603UC047JST
designator L?  Inductance: 47nH
Inductor, 47nH, ±5%, 280mΩ, 600mA, SMD 0603; Manufacturer: FH(Guangdong Fenghua Advanced Tech); Manufacturer Part Number: FHW0603UC047JST; Self-Resonant Frequency: 2GHz; Q Factor: 36@200MHz; Package Size: 0603; JLCPCB Basic Part: No; JLCPCB Part Number: C142358; Supplier 1: LCSC; Category: Inductors; Supplier Part Number 1: C142358; Tolerance: ±5%; Rated Current: 600mA; DC Resistance: 280mΩ; RoHS: Yes; ComponentLink1Description: Datasheet; ComponentLink1URL: https://wmsc.lcsc.com/wmsc/upload/file/pdf/v2/lcsc/2302231230_FH--Guangdong-Fenghua-Advanced-Tech-FHW0603UC047JST_C142358.pdf; ComponentLink2Description: JLCPCB Part URL; ComponentLink2URL: https://jlcpcb.com/partdetail/C142358; ComponentLink3Description: LCSC Part URL; ComponentLink3URL: https://lcsc.com/product-detail/Inductors-SMD_FH-Guangdong-Fenghua-Advanced-Tech-FH-Guangdong-Fenghua-Advanced-Tech-FHW0603UC047JST_C142358.html
footprint IND-0603 (0603 (1608M) Inductor)
pins: 1, 2

## FHW0603UC056JST
designator L?  Inductance: 56nH
Inductor, 56nH, ±5%, 280mΩ, 600mA, SMD 0603; Manufacturer: FH(Guangdong Fenghua Advanced Tech); Manufacturer Part Number: FHW0603UC056JST; Self-Resonant Frequency: 1.9GHz; Q Factor: 38@200MHz; Package Size: 0603; JLCPCB Basic Part: No; JLCPCB Part Number: C304269; Supplier 1: LCSC; Category: Inductors; Supplier Part Number 1: C304269; Tolerance: ±5%; Rated Current: 600mA; DC Resistance: 280mΩ; RoHS: Yes; ComponentLink1Description: Datasheet; ComponentLink1URL: https://wmsc.lcsc.com/wmsc/upload/file/pdf/v2/lcsc/2302231030_FH--Guangdong-Fenghua-Advanced-Tech-FHW0603UC056JST_C304269.pdf; ComponentLink2Description: JLCPCB Part URL; ComponentLink2URL: https://jlcpcb.com/partdetail/C304269; ComponentLink3Description: LCSC Part URL; ComponentLink3URL: https://lcsc.com/product-detail/Inductors-SMD_FH-Guangdong-Fenghua-Advanced-Tech-FH-Guangdong-Fenghua-Advanced-Tech-FHW0603UC056JST_C304269.html
footprint IND-0603 (0603 (1608M) Inductor)
pins: 1, 2

## FHW0603UC068JST_C142357
designator L?  Inductance: 68nH
Inductor, 68nH, ±5%, 340mΩ, 600mA, SMD 0603; Manufacturer: FH(Guangdong Fenghua Advanced Tech); Manufacturer Part Number: FHW0603UC068JST; Self-Resonant Frequency: 1.7GHz; Q Factor: 36@200MHz; Package Size: 0603; JLCPCB Basic Part: No; JLCPCB Part Number: C142357; Supplier 1: LCSC; Category: Inductors; Supplier Part Number 1: C142357; Tolerance: ±5%; Rated Current: 600mA; DC Resistance: 340mΩ; RoHS: Yes; ComponentLink1Description: Datasheet; ComponentLink1URL: https://wmsc.lcsc.com/wmsc/upload/file/pdf/v2/lcsc/2302231230_FH--Guangdong-Fenghua-Advanced-Tech-FHW0603UC068JST_C142357.pdf; ComponentLink2Description: JLCPCB Part URL; ComponentLink2URL: https://jlcpcb.com/partdetail/C142357; ComponentLink3Description: LCSC Part URL; ComponentLink3URL: https://lcsc.com/product-detail/Inductors-SMD_FH-Guangdong-Fenghua-Advanced-Tech-FH-Guangdong-Fenghua-Advanced-Tech-FHW0603UC068JST_C142357.html
footprint IND-0603 (0603 (1608M) Inductor)
pins: 1, 2

## FHW0603UC068JST_C443718
designator L?  Inductance: 68nH
Inductor, 68nH, ±5%, 340mΩ, 600mA, SMD 0603; Manufacturer: FH(Guangdong Fenghua Advanced Tech); Manufacturer Part Number: FHW0603UC068JST; Self-Resonant Frequency: 1.7GHz; Q Factor: 36@200MHz; Package Size: 0603; JLCPCB Basic Part: No; JLCPCB Part Number: C443718; Supplier 1: LCSC; Category: Inductors; Supplier Part Number 1: C443718; Tolerance: ±5%; Rated Current: 600mA; DC Resistance: 340mΩ; RoHS: Yes; ComponentLink1Description: Datasheet; ComponentLink1URL: https://wmsc.lcsc.com/wmsc/upload/file/pdf/v2/lcsc/2302231130_FH--Guangdong-Fenghua-Advanced-Tech-FHW0603UC068JST_C443718.pdf; ComponentLink2Description: JLCPCB Part URL; ComponentLink2URL: https://jlcpcb.com/partdetail/C443718; ComponentLink3Description: LCSC Part URL; ComponentLink3URL: https://lcsc.com/product-detail/Inductors-SMD_FH-Guangdong-Fenghua-Advanced-Tech-FH-Guangdong-Fenghua-Advanced-Tech-FHW0603UC068JST_C443718.html
footprint IND-0603 (0603 (1608M) Inductor)
pins: 1, 2

## FHW0603UC075JST
designator L?  Inductance: 75nH
Inductor, 75nH, ±5%, 600mΩ, 400mA, SMD 0603; Manufacturer: FH(Guangdong Fenghua Advanced Tech); Manufacturer Part Number: FHW0603UC075JST; Package Size: 0603; JLCPCB Basic Part: No; JLCPCB Part Number: C395033; Supplier 1: LCSC; Category: Inductors; Supplier Part Number 1: C395033; Tolerance: ±5%; Rated Current: 400mA; DC Resistance: 600mΩ; RoHS: Yes; ComponentLink1Description: Datasheet; ComponentLink1URL: https://wmsc.lcsc.com/wmsc/upload/file/pdf/v2/lcsc/2302231208_FH--Guangdong-Fenghua-Advanced-Tech-FHW0603UC075JST_C395033.pdf; ComponentLink2Description: JLCPCB Part URL; ComponentLink2URL: https://jlcpcb.com/partdetail/C395033; ComponentLink3Description: LCSC Part URL; ComponentLink3URL: https://lcsc.com/product-detail/Inductors-SMD_FH-Guangdong-Fenghua-Advanced-Tech-FH-Guangdong-Fenghua-Advanced-Tech-FHW0603UC075JST_C395033.html
footprint IND-0603 (0603 (1608M) Inductor)
pins: 1, 2

## FHW0603UC082JST
designator L?  Inductance: 82nH
Inductor, 82nH, ±5%, 550mΩ, 400mA, SMD 0603; Manufacturer: FH(Guangdong Fenghua Advanced Tech); Manufacturer Part Number: FHW0603UC082JST; Self-Resonant Frequency: 1.7GHz; Q Factor: 34@150MHz; Package Size: 0603; JLCPCB Basic Part: No; JLCPCB Part Number: C139255; Supplier 1: LCSC; Category: Inductors; Supplier Part Number 1: C139255; Tolerance: ±5%; Rated Current: 400mA; DC Resistance: 550mΩ; RoHS: Yes; ComponentLink1Description: Datasheet; ComponentLink1URL: https://wmsc.lcsc.com/wmsc/upload/file/pdf/v2/lcsc/2302231230_FH--Guangdong-Fenghua-Advanced-Tech-FHW0603UC082JST_C139255.pdf; ComponentLink2Description: JLCPCB Part URL; ComponentLink2URL: https://jlcpcb.com/partdetail/C139255; ComponentLink3Description: LCSC Part URL; ComponentLink3URL: https://lcsc.com/product-detail/Inductors-SMD_FH-Guangdong-Fenghua-Advanced-Tech-FH-Guangdong-Fenghua-Advanced-Tech-FHW0603UC082JST_C139255.html
footprint IND-0603 (0603 (1608M) Inductor)
pins: 1, 2

## FHW0603UCR10JST
designator L?  Inductance: 100nH
Inductor, 100nH, ±5%, 630mΩ, 400mA, SMD 0603; Manufacturer: FH(Guangdong Fenghua Advanced Tech); Manufacturer Part Number: FHW0603UCR10JST; Self-Resonant Frequency: 1.4GHz; Q Factor: 30@150MHz; Package Size: 0603; JLCPCB Basic Part: No; JLCPCB Part Number: C295699; Supplier 1: LCSC; Category: Inductors; Supplier Part Number 1: C295699; Tolerance: ±5%; Rated Current: 400mA; DC Resistance: 630mΩ; RoHS: Yes; ComponentLink1Description: Datasheet; ComponentLink1URL: https://wmsc.lcsc.com/wmsc/upload/file/pdf/v2/lcsc/2302231208_FH--Guangdong-Fenghua-Advanced-Tech-FHW0603UCR10JST_C295699.pdf; ComponentLink2Description: JLCPCB Part URL; ComponentLink2URL: https://jlcpcb.com/partdetail/C295699; ComponentLink3Description: LCSC Part URL; ComponentLink3URL: https://lcsc.com/product-detail/Inductors-SMD_FH-Guangdong-Fenghua-Advanced-Tech-FH-Guangdong-Fenghua-Advanced-Tech-FHW0603UCR10JST_C295699.html
footprint IND-0603 (0603 (1608M) Inductor)
pins: 1, 2

## FHW0603UCR12JST
designator L?  Inductance: 120nH
Inductor, 120nH, ±5%, 730mΩ, 300mA, SMD 0603; Manufacturer: FH(Guangdong Fenghua Advanced Tech); Manufacturer Part Number: FHW0603UCR12JST; Self-Resonant Frequency: 1.3GHz; Q Factor: 32@150MHz; Package Size: 0603; JLCPCB Basic Part: No; JLCPCB Part Number: C317988; Supplier 1: LCSC; Category: Inductors; Supplier Part Number 1: C317988; Tolerance: ±5%; Rated Current: 300mA; DC Resistance: 730mΩ; RoHS: Yes; ComponentLink1Description: Datasheet; ComponentLink1URL: https://wmsc.lcsc.com/wmsc/upload/file/pdf/v2/lcsc/2302231208_FH--Guangdong-Fenghua-Advanced-Tech-FHW0603UCR12JST_C317988.pdf; ComponentLink2Description: JLCPCB Part URL; ComponentLink2URL: https://jlcpcb.com/partdetail/C317988; ComponentLink3Description: LCSC Part URL; ComponentLink3URL: https://lcsc.com/product-detail/Inductors-SMD_FH-Guangdong-Fenghua-Advanced-Tech-FH-Guangdong-Fenghua-Advanced-Tech-FHW0603UCR12JST_C317988.html
footprint IND-0603 (0603 (1608M) Inductor)
pins: 1, 2

## FHW0603UCR15JST
designator L?  Inductance: 150nH
Inductor, 150nH, ±5%, 800mΩ, 280mA, SMD 0603; Manufacturer: FH(Guangdong Fenghua Advanced Tech); Manufacturer Part Number: FHW0603UCR15JST; Self-Resonant Frequency: 990MHz; Q Factor: 28@150MHz; Package Size: 0603; JLCPCB Basic Part: No; JLCPCB Part Number: C295700; Supplier 1: LCSC; Category: Inductors; Supplier Part Number 1: C295700; Tolerance: ±5%; Rated Current: 280mA; DC Resistance: 800mΩ; RoHS: Yes; ComponentLink1Description: Datasheet; ComponentLink1URL: https://wmsc.lcsc.com/wmsc/upload/file/pdf/v2/lcsc/2302231208_FH--Guangdong-Fenghua-Advanced-Tech-FHW0603UCR15JST_C295700.pdf; ComponentLink2Description: JLCPCB Part URL; ComponentLink2URL: https://jlcpcb.com/partdetail/C295700; ComponentLink3Description: LCSC Part URL; ComponentLink3URL: https://lcsc.com/product-detail/Inductors-SMD_FH-Guangdong-Fenghua-Advanced-Tech-FH-Guangdong-Fenghua-Advanced-Tech-FHW0603UCR15JST_C295700.html
footprint IND-0603 (0603 (1608M) Inductor)
pins: 1, 2

## FHW0603UCR18JST
designator L?  Inductance: 180nH
Inductor, 180nH, ±5%, 1.45Ω, 240mA, SMD 0603; Manufacturer: FH(Guangdong Fenghua Advanced Tech); Manufacturer Part Number: FHW0603UCR18JST; Self-Resonant Frequency: 990MHz; Q Factor: 25@100MHz; Package Size: 0603; JLCPCB Basic Part: No; JLCPCB Part Number: C317989; Supplier 1: LCSC; Category: Inductors; Supplier Part Number 1: C317989; Tolerance: ±5%; Rated Current: 240mA; DC Resistance: 1.45Ω; RoHS: Yes; ComponentLink1Description: Datasheet; ComponentLink1URL: https://wmsc.lcsc.com/wmsc/upload/file/pdf/v2/lcsc/2302231208_FH--Guangdong-Fenghua-Advanced-Tech-FHW0603UCR18JST_C317989.pdf; ComponentLink2Description: JLCPCB Part URL; ComponentLink2URL: https://jlcpcb.com/partdetail/C317989; ComponentLink3Description: LCSC Part URL; ComponentLink3URL: https://lcsc.com/product-detail/Inductors-SMD_FH-Guangdong-Fenghua-Advanced-Tech-FH-Guangdong-Fenghua-Advanced-Tech-FHW0603UCR18JST_C317989.html
footprint IND-0603 (0603 (1608M) Inductor)
pins: 1, 2
